# Altium integrated library CbyP.IntLib: 1144 symbols (part 1 of 6)
Pins are listed as number, name and electrical type; pins without a type are passive.

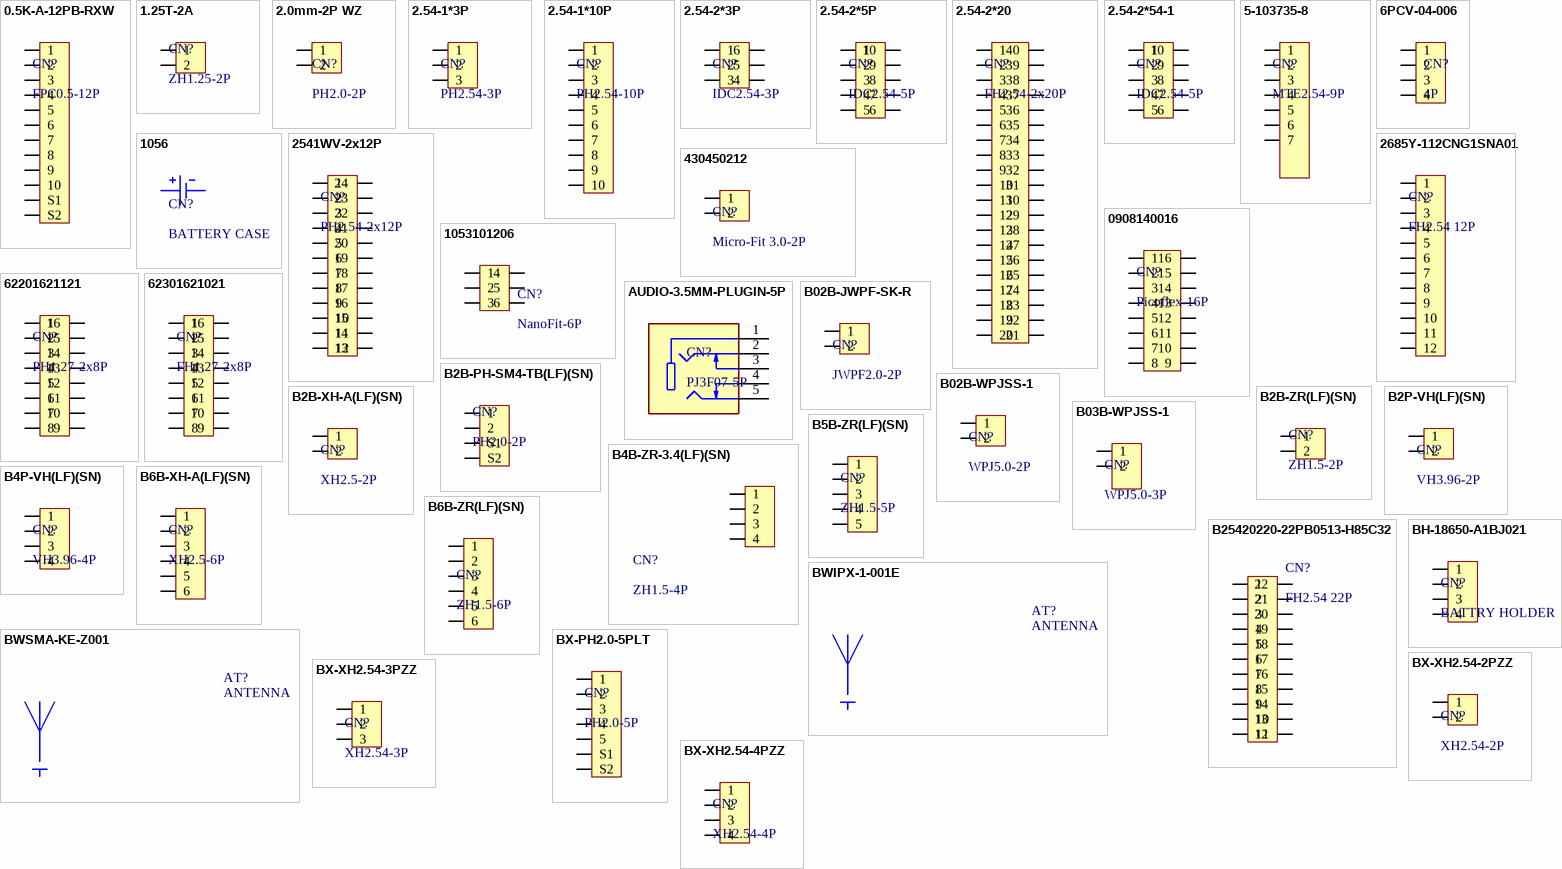
[diagram p0: symbols 0.5K-A-12PB-RXW to BX-XH2.54-4PZZ]

## 0.5K-A-12PB-RXW
designator CN?, comment FPC0.5-12P
Slide Lock -25℃~+85℃ 12P 0.5mm Single-side Contact/Vertical Surface Mount,Vertical SMD,P=0.5mm(Staggered Pins) FFC, FPC (Flat Flexible) Connector Housings RoHS; Manufacturer: GUOCONN; Mfr.Part #: 0.5K-A-12PB-RXW; LCSC Part #: C51901160; Package: SMD,P=0.5mm(Staggered Pins)
footprint FPC0.5-12P, Vertical SMD
pins: 1, 2, 3, 4, 5, 6, 7, 8, 9, 10, 11 S1, 12 S2

## 1.25T-2A
designator CN?, comment ZH1.25-2P
2P 1x2P PicoBlade(MX 1.25) Tin -25℃~+85℃ Beige 1.25mm 250V 2 3A 1 Through Hole Through Hole,P=1.25mm Headers, Male Pins RoHS; Manufacturer: BOOMELE(Boom Precision Elec); Mfr.Part #: 1.25T-2A; LCSC Part #: C145970; Package: Through Hole,P=1.25mm; DigiKey Part Number: NO
footprint Plugin,P=1.25mm,2P
pins: 1, 2

## 2.0mm-2P WZ
designator CN?, comment PH2.0-2P
2P 1x2P PH Tin -25℃~+85℃ White 2mm 250V 2 1A 1 Right Angle Through Hole,Right Angle,P=2mm Headers, Male Pins RoHS; Manufacturer: SHOU HAN; Mfr.Part #: 2.0MM-2P WZ; So_Chan_Dan: 0; LCSC Part #: C5368738; Package: Through Hole,Right Angle,P=2mm; DigiKey Part Number: NO
footprint Push-Pull,P=2mm,2P-2
footprint Push-Pull,P=2mm,2P-1
footprint Plugin,P=2.54mm,2P-1
pins: 1, 2

## 2.54-1*3P
designator CN?, comment PH2.54-3P
3P 1x3P Gold Brass -40℃~+105℃ Black Pin Header 2.54mm 2.5mm 6mm 3mm 1 3A Through Hole Through Hole,P=2.54mm Headers, Male Pins RoHS; Manufacturer: BOOMELE(Boom Precision Elec); Mfr.Part #: 2.54-1*3P; LCSC Part #: C49257; Package: Through Hole,P=2.54mm; DigiKey Part Number: NO
footprint Plugin,P=2.54mm,3P,Pin Headers
pins: 1, 2, 3

## 2.54-1*10P
designator CN?, comment PH2.54-10P
CONN HEADER 10POS 2.54mm SINGLE ROW TH; Manufacturer: BOOMELE(Boom Precision Elec); Mfr.Part #: 2.54-1*10P; LCSC Part #: C57369; Package: Plugin,P=2.54mm
footprint Plugin,P=2.54mm,10P,Pin Headers
pins: 1, 2, 3, 4, 5, 6, 7, 8, 9, 10

## 2.54-2*3P
designator CN?, comment IDC2.54-3P
Connector IDC Header Through Hole, Right Angle 6 position 2.54mm; Manufacturer: BOOMELE(Boom Precision Elec); Mfr.Part #: 2.54-2*3P; LCSC Part #: C34945; Package: Through Hole,Right Angle,P=2.54mm; DigiKey Part Number: NO; ComponentLink1Description: Link; ComponentLink1URL: https://www.lcsc.com/product-detail/C34945.html
footprint IDC Through Hole,Right Angle,P=2.54mm, 2x3P
pins: 1, 2, 3, 4, 5, 6

## 2.54-2*5P
designator CN?, comment IDC2.54-5P
Connector IDC Header Through Hole 10 position 2.54mm; Manufacturer: BOOMELE(Boom Precision Elec); Mfr.Part #: 2.54-2*5P; LCSC Part #: C5665; Package: Through Hole,P=2.54mm; DigiKey Part Number: NO; ComponentLink1Description: Link; ComponentLink1URL: https://www.lcsc.com/product-detail/C5665.html?s_z=n_2.54-2%2a5P
footprint IDC Through Hole,Right Angle,P=2.54mm, 2x5P
pins: 1, 2, 3, 4, 5, 6, 7, 8, 9, 10

## 2.54-2*20
designator CN?, comment FH2.54-2x20P
Female Header 40 Position 2.54mm Pitch Dual Row Through Hole -40℃~+105℃; Manufacturer: ZHOURI; Mfr.Part #: 2.54-2*20; LCSC Part #: C2977589; Package: Through Hole,P=2.54mm; DigiKey Part Number: NO; ComponentLink1Description: Link; ComponentLink1URL: https://www.lcsc.com/datasheet/C2977589.pdf
footprint Plugin,P=2.54mm,2x20P,Female Headers
pins: 1, 2, 3, 4, 5, 6, 7, 8, 9, 10, 11, 12, 13, 14, 15, 16, 17, 18, 19, 20, 21, 22, 23, 24, 25, 26, 27, 28, 29, 30, 31, 32, 33, 34, 35, 36, 37, 38, 39, 40

## 2.54-2*54-1
designator CN?, comment IDC2.54-5P
Connector IDC Header Through Hole, Right Angle 10 position 2.54mm; Manufacturer: BOOMELE(Boom Precision Elec); Mfr.Part #: 2.54-2*5P; LCSC Part #: C9140; Package: Through Hole,Right Angle,P=2.54mm; DigiKey Part Number: NO; ComponentLink1Description: Link; ComponentLink1URL: https://www.lcsc.com/product-detail/C9140.html?s_z=n_2.54-2%2a5P
footprint IDC Through Hole,P=2.54mm, 2X5P
pins: 1, 2, 3, 4, 5, 6, 7, 8, 9, 10

## 5-103735-8
designator CN?, comment MTE2.54-9P
Connector Header Through Hole 9 position 0.100" (2.54mm); Manufacturer: TE Connectivity AMP Connectors; Mfr.Part #: 5-103735-8; DigiKey Part Number: A33940-ND; Package: Plugin,P=2.54mm
footprint Plugin,P=2.54mm,7P
footprint Plugin,P=2.54mm,7P-1
pins: 1, 2, 3, 4, 5, 6, 7

## 6PCV-04-006
designator CN?, comment 4P
4 Circuit 0.375" (9.53mm) Barrier Block Connector Screws; Manufacturer: TE Connectivity AMP Connectors; Mfr.Part #: 6PCV-04-006; So_Chan_Cam: 2; So_Chan_Dan: 0; Web: Digikey; Name: 6PCV-04-006; Package: Plugin,P=375mil; ComponentLink1Description: Link; ComponentLink1URL: https://www.te.com/usa-en/product-4-1437652-0.datasheet.pdf
footprint Plugin,P=375mil,L=811mil,4P
pins: 1, 2, 3, 4

## 1056
designator CN?, comment BATTERY CASE
SMD Battery Product Accessories RoHS; Manufacturer: Keystone; Mfr.Part #: 1056; So_Chan_Cam: 0; LCSC Part #: C238067; Package: SMD
footprint SMD,BAT_CASE_1056
pins: 1, 2

## 2541WV-2x12P
designator CN?, comment PH2.54-2x12P
Gold Straight Policy 2.54mm 6mm 24P -55℃~+105℃ 3mm 2.54mm Double Row 2x12P Plugin,P=2.54mm Pin Headers ROHS; Manufacturer: HanElectricity; Mfr.Part #: 2541WV-2x12P; Package: Plugin,P=2.54mm; LCSC Part #: C5383110
footprint Plugin,P=2.54mm,2X12P,Pin Headers
pins: 1, 2, 3, 4, 5, 6, 7, 8, 9, 10, 11, 12, 13, 14, 15, 16, 17, 18, 19, 20, 21, 22, 23, 24

## 2685Y-112CNG1SNA01
designator CN?, comment FH2.54 12P
2.54mm 2.54mm 3A Single Row Gold 12P -40℃~+105℃ Brass Straight 1x12P 8.5mm Top Square Hole Plugin,P=2.54mm Female Headers ROHS; Manufacturer: HOAUC; Mfr.Part #: 2685Y-112CNG1SNA01; Package: Plugin,P=2.54mm; LCSC Part #: C5110232
footprint Plugin,P=2.54mm,12p,Female Headers
pins: 1, 2, 3, 4, 5, 6, 7, 8, 9, 10, 11, 12

## 430450212
designator CN?, comment Micro-Fit 3.0-2P
2x1P 2P Micro-Fit(MX 3.0) Tin 3mm 1 -40℃~+105℃ 8.5A 2 3mm Brass Through Hole Plugin,P=3mm Wire To Board Connector ROHS; Manufacturer: MOLEX; Mfr.Part #: 430450212; LCSC Part #: C293362; Package: Plugin,P=3mm
footprint Push-Pull,P=2.54mm,2P
pins: 1, 2

## 0908140016
designator CN?, comment Picoflex-16P
Connector Header Surface Mount 16 position 0.050" (1.27mm); Manufacturer: Molex; Mfr.Part #: 0908140016; DigiKey Part Number: WM19280-ND; Package: SMD,1.27mm
footprint Plugin,P=2.54mm,2x15P,Female Headers
pins: 1, 2, 3, 4, 5, 6, 7, 8, 9, 10, 11, 12, 13, 14, 15, 16

## 1053101206
designator CN?, comment NanoFit-6P
Connector Header Through Hole 6 position 0.098" (2.50mm); Manufacturer: Molex; Mfr.Part #: 1053101206; DigiKey Part Number: WM14970-ND; Package: Plugin,P=2.5mm
footprint Plugin,P=2.5mm,2X3P,Nano-Fit 6P Male
pins: 1, 2, 3, 4, 5, 6

## 62201621121
designator CN?, comment PH1.27-2x8P
Connector Header Through Hole 16 position 0.050" (1.27mm); Manufacturer: Würth Elektronik; Mfr.Part #: 62201621121; DigiKey Part Number: 732-5376-ND; Package: Plugin,P=1.27mm
footprint Plugin,P=1.27mm,2X8P,Pin Headers
pins: 1, 2, 3, 4, 5, 6, 7, 8, 9, 10, 11, 12, 13, 14, 15, 16

## 62301621021
designator CN?, comment FH1.27-2x8P
16 Position Receptacle Connector 0.050" (1.27mm) Surface Mount Gold; Manufacturer: Würth Elektronik; Mfr.Part #: 62301621021; DigiKey Part Number: 732-62301621021-ND; Package: SMD,P=1.27mm
footprint SMD,P=1.27mm,2x8P
pins: 1, 2, 3, 4, 5, 6, 7, 8, 9, 10, 11, 12, 13, 14, 15, 16

## AUDIO-3.5MM-PLUGIN-5P
designator CN?, comment PJ3F07-5P
-30℃~+70℃ 3.5mm headphone jack 30V 500mA Plugin Audio Connectors ROHS; MF: CUI Devices; MP: SJ1-3525N; SnapEDA_Link: https://www.snapeda.com/parts/SJ1-3525N/CUI+Devices/view-part/?ref=snap; Package: None; Value: *; CUI_purchase_URL: https://www.cuidevices.com/product/interconnect/connectors/audio-connectors/jacks/sj1-3525n?utm_source=snapeda.com&utm_medium=referral&utm_campaign=snapedaBOM; Check_prices: https://www.snapeda.com/parts/SJ1-3525N/CUI+Devices/view-part/?ref=eda
footprint AUDIO-3.5MM-PLUGIN-5P
pins: 1, 2, 3, 4, 5

## B02B-JWPF-SK-R
designator CN?, comment JWPF2.0-2P
Connector Header Through Hole 2 position 0.079" (2.00mm); Manufacturer: JST Sales America Inc.; Mfr.Part #: B02B-JWPF-SK-R; DigiKey Part Number: 455-1991-ND; Package: Plugin,P=2mm
footprint Push-Pull,P=2.54mm,2P
pins: 1, 2

## B2B-PH-SM4-TB(LF)(SN)
designator CN?, comment PH2.0-2P
Connector Header 2 position 2mm Pitch 2A Surface Mount,Vertical -25℃~+85℃; Manufacturer: JST; Mfr.Part #: B2B-PH-SM4-TB(LF)(SN); DigiKey Part Number: 455-B2B-PH-SM4-TBTR-ND; Package: SMD,P=2mm; LCSC Part #: C160352; ComponentLink1Description: Link; ComponentLink1URL: https://www.lcsc.com/product-detail/C160352.html; ComponentLink2Description: Link 1; ComponentLink2URL: https://www.digikey.com/en/products/detail/jst-sales-america-inc/B2B-ZR/926564?s=N4IgTCBcDaIEJjgWhttps://www.digikey.com/en/products/detail/jst-sales-america-inc/B2B-PH-SM4-TB/926641?s=N4IgTCBcDaIEJjgWgAoAkkGUCyAWJAKnABQAyAYgJTGYBylIAugL5AgFoCUAUAZAYgSgwGUA5PEAXQF8g
footprint SMD,P=2mm,2P
pins: 1, 2, S1, S2

## B02B-WPJSS-1
designator CN?, comment WPJ5.0-2P
Connector Header Through Hole 2 position 0.197" (5.00mm); Manufacturer: JST Sales America Inc.; Mfr.Part #: B02B-WPJSS-1; DigiKey Part Number: 455-B02B-WPJSS-1-ND; Package: Plugin,P=5mm
footprint Push-Pull,P=2.54mm,2P
pins: 1, 2

## B2B-XH-A(LF)(SN)
designator CN?, comment XH2.5-2P
Connector Header 2 position 2.5mm Pitch 3A Through Hole -25℃~+85℃; Manufacturer: JST; Mfr.Part #: B2B-XH-A(LF)(SN); LCSC Part #: C158012; Package: Through Hole,P=2.5mm; DigiKey Part Number: 455-B2B-XH-A-ND; ComponentLink1Description: Link; ComponentLink1URL: https://www.lcsc.com/product-detail/C158012.html?s_z=n_B2B-XH-A; ComponentLink2Description: Link 1; ComponentLink2URL: https://www.digikey.com/en/products/detail/jst-sales-america-inc/B2B-XH-A/1651045?s=N4IgTCBcDaIEJjgWgBoAkkEEAUAZAYgJTYDKAcoSALoC%2BQA
footprint Through Hole,P=2.5mm,2P,JST
pins: 1, 2

## B2B-ZR(LF)(SN)
designator CN?, comment ZH1.5-2P
2P 1x2P ZH Tin -25℃~+85℃ White 1.5mm 50V 2 1A 1 Through Hole Through Hole,P=1.5mm Headers, Male Pins ROHS; Manufacturer: JST; Mfr.Part #: B2B-ZR(LF)(SN); DigiKey Part Number: 455-B2B-ZR(LF)(SN)(P)-ND; Package: Through Hole,P=1.5mm; LCSC Part #: C158011; ComponentLink1Description: Link; ComponentLink1URL: https://www.lcsc.com/product-detail/C158011.html?s_z=n_C158011; ComponentLink2Description: Link 1; ComponentLink2URL: https://www.digikey.com/en/products/detail/jst-sales-america-inc/B2B-ZR/926564?s=N4IgTCBcDaIEJjgWgFoCUAUAZAYgSgwGUA5PEAXQF8g
footprint Plugin,P=1.5mm,2P
pins: 1, 2

## B2P-VH(LF)(SN)
designator CN?, comment VH3.96-2P
Connector Header 2 position 3.96mm Pitch 10A Through Hole -25℃~+85℃; Manufacturer: JST; Mfr.Part #: B2P-VH(LF)(SN); LCSC Part #: C160315; Package: Through Hole,P=3.96mm; DigiKey Part Number: 455-1639-ND; ComponentLink1Description: Link; ComponentLink1URL: https://www.lcsc.com/product-detail/C160315.html?s_z=n_C160315; ComponentLink2Description: Link 1; ComponentLink2URL: https://www.digikey.com/en/products/detail/jst-sales-america-inc/B2P-VH/926547?s=N4IgTCBcDaIEJgAoFoBqAJAFAGQGIEpMBlAOXxAF0BfIA
footprint Through Hole,P=3.96mm,2P
pins: 1, 2

## B03B-WPJSS-1
designator CN?, comment WPJ5.0-3P
Connector Header Through Hole 3 position 0.197" (5.00mm); Manufacturer: JST Sales America Inc.; Mfr.Part #: B03B-WPJSS-1; DigiKey Part Number: 455-B03B-WPJSS-1-ND; Package: Plugin,P=5mm
footprint Push-Pull,P=2.54mm,2P
pins: 1, 2

## B4B-ZR-3.4(LF)(SN)
designator CN?, comment ZH1.5-4P
Connector Header 4 position 1.5mm Pitch 1A Through Hole -25℃~+85℃; Manufacturer: JST; Mfr.Part #: B4B-ZR-3.4(LF)(SN); LCSC Part #: C163034; Package: Through Hole,P=1.5mm; DigiKey Part Number: 455-B4B-ZR-3.4-ND; ComponentLink1Description: Link; ComponentLink1URL: https://www.lcsc.com/product-detail/C163034.html?s_z=n_B4B-ZR-3.4%28LF%29%28SN%29; ComponentLink2Description: Link 1; ComponentLink2URL: https://www.digikey.com/en/products/detail/jst-sales-america-inc/B4B-ZR-3-4/7802273?s=N4IgTCBcDaIEIBY4FoBaAlZBmAdAgFADIBiAlPgMoBypIAugL5A
footprint Plugin,P=1.5mm,4P
pins: 1, 2, 3, 4

## B4P-VH(LF)(SN)
designator CN?, comment VH3.96-4P
1x4P 4P VH Tin 4 -25℃~+85℃ 10A 1 3.96mm Brass Through Hole Through Hole,P=3.96mm Wire To Board Connector ROHS; Manufacturer: JST; Mfr.Part #: B4P-VH(LF)(SN); LCSC Part #: C160317; Package: Through Hole,P=3.96mm
footprint Push-Pull,P=3.96mm,4P
pins: 1, 2, 3, 4

## B5B-ZR(LF)(SN)
designator CN?, comment ZH1.5-5P
1x5P 5P ZH Tin 5 -25℃~+85℃ 1A 1 1.5mm Brass Straight Plugin,P=1.5mm Wire To Board Connector ROHS; Manufacturer: JST; Mfr.Part #: B5B-ZR(LF)(SN); LCSC Part #: C157990; Package: Plugin,P=1.5mm
footprint Plugin,P=1.5mm,5P
pins: 1, 2, 3, 4, 5

## B6B-XH-A(LF)(SN)
designator CN?, comment XH2.5-6P
Connector Header 6 position 2.5mm Pitch 3A Through Hole -25℃~+85℃; Manufacturer: JST; Mfr.Part #: B6B-XH-A(LF)(SN); LCSC Part #: C144397; Package: Through Hole,P=2.5mm; DigiKey Part Number: 455-B6B-XH-A-ND; ComponentLink1Description: Link; ComponentLink1URL: https://www.lcsc.com/product-detail/C144397.html; ComponentLink2Description: Link 1; ComponentLink2URL: https://www.digikey.com/en/products/detail/jst-sales-america-inc/B6B-XH-A/1000381?s=N4IgTCBcDaIEIDY4FoAaAJZBBAFAGQDEBKHAZQDkiQBdAXyA
footprint Through Hole,P=2.5mm,6P,JST
pins: 1, 2, 3, 4, 5, 6

## B6B-ZR(LF)(SN)
designator CN?, comment ZH1.5-6P
1x6P 6P ZH Tin 6 -25℃~+85℃ 1A 1 1.5mm Brass Straight Plugin,P=1.5mm Wire To Board Connector ROHS; Manufacturer: JST; Mfr.Part #: B6B-ZR(LF)(SN); LCSC Part #: C157984; Package: Through Hole,P=1.5mm; DigiKey Part Number: 455-B6B-ZR-ND
footprint Plugin,P=1.5mm,6P
pins: 1, 2, 3, 4, 5, 6

## B25420220-22PB0513-H85C32
designator CN?, comment FH2.54 22P
2.54mm 1 22P Gold -40℃~+105℃ 1x22P Top 8.5mm 3A Square Hole Through Hole Through Hole,P=2.54mm Headers, Receptacles, Female Sockets ROHS; Manufacturer: HMTCONN; Mfr.Part #: B25420220-22PB0513-H85C32; LCSC Part #: C42385708; Package: Through Hole,P=2.54mm
footprint Plugin,P=2.54mm,22P,Female Headers
pins: 1, 2, 3, 4, 5, 6, 7, 8, 9, 10, 11, 12, 13, 14, 15, 16, 17, 18, 19, 20, 21, 22

## BH-18650-A1BJ021
designator CN?, comment BATTRY HOLDER
BATTERY HOLDER CYLINDRICAL TH; Manufacturer: MYOUNG; Mfr.Part #: BH-18650-A1BJ021; LCSC Part #: C20606804; Package: BATTRY HOLDER
footprint BATTERY_HOLDER_18650_TH,2S
pins: 1, 2, 3, 4

## BWIPX-1-001E
designator AT?, comment ANTENNA
Connector Receptacle IPEX Male Pin 50Ω Surface Mount; Manufacturer: BAT WIRELESS; Mfr.Part #: BWIPX-1-001E; Package: SMD; LCSC Part #: C496552; DigiKey Part Number: NO; ComponentLink1Description: Link; ComponentLink1URL: https://www.lcsc.com/product-detail/C496552.html?s_z=n_BWIPX-1-001E; ComponentLink2Description: Link 1
footprint IPEX-SMD
pins: 1, 2 GND, 3 GND, 4 GND

## BWSMA-KE-Z001
designator AT?, comment ANTENNA
CONN RCPT SMA 50Ω TH; Manufacturer: BAT WIRELESS; Mfr.Part #: BWSMA-KE-Z001; Package: Through Hole; LCSC Part #: C496549
footprint ANTENNA, Through Hole, SMA
pins: 1, 2 GND, 3 GND, 4 GND, 5 GND

## BX-PH2.0-5PLT
designator CN?, comment PH2.0-5P
CONN HEADER SMD 5POS 2mm; Manufacturer: Bossie; Mfr.Part #: BX-PH2.0-5PLT; LCSC Part #: C18077902; Package: SMD,P=2mm
footprint SMD,P=2mm,5P
pins: 1, 2, 3, 4, 5, S1 S2, S2 S1

## BX-XH2.54-2PZZ
designator CN?, comment XH2.54-2P
Connector Header 2 position 2.5mm Pitch 3A Through Hole -25℃~+85℃; Manufacturer: Bossie; Mfr.Part #: BX-XH2.54-2PZZ; LCSC Part #: C18077833; Package: Through Hole,P=2.5mm; DigiKey Part Number: NO; ComponentLink1Description: Link; ComponentLink1URL: https://www.lcsc.com/product-detail/C18077833.html?s_z=n_BX-XH2.54-2PZZ
footprint Plugin,P=2.54mm,2P
pins: 1, 2

## BX-XH2.54-3PZZ
designator CN?, comment XH2.54-3P
Connector Header 3 position 2.5mm Pitch 3A Through Hole -25℃~+85℃; Manufacturer: Bossie; Mfr.Part #: BX-XH2.54-3PZZ; LCSC Part #: C18077834; Package: Through Hole,P=2.5mm; DigiKey Part Number: NO; ComponentLink1Description: Link; ComponentLink1URL: https://www.lcsc.com/product-detail/C18077834.html?s_z=n_BX-XH2.54-3PZZ
footprint Plugin,P=2.54mm,3P
pins: 1, 2, 3

## BX-XH2.54-4PZZ
designator CN?, comment XH2.54-4P
Connector Header 4 position 2.5mm Pitch 3A Through Hole -25℃~+85℃; Manufacturer: Bossie; Mfr.Part #: BX-XH2.54-4PZZ; LCSC Part #: C18077835; Package: Through Hole,P=2.5mm; DigiKey Part Number: NO; ComponentLink1Description: Link; ComponentLink1URL: https://www.lcsc.com/product-detail/C18077835.html?s_z=n_BX-XH2.54-4PZZ
footprint Plugin,P=2.54mm,4P
pins: 1, 2, 3, 4

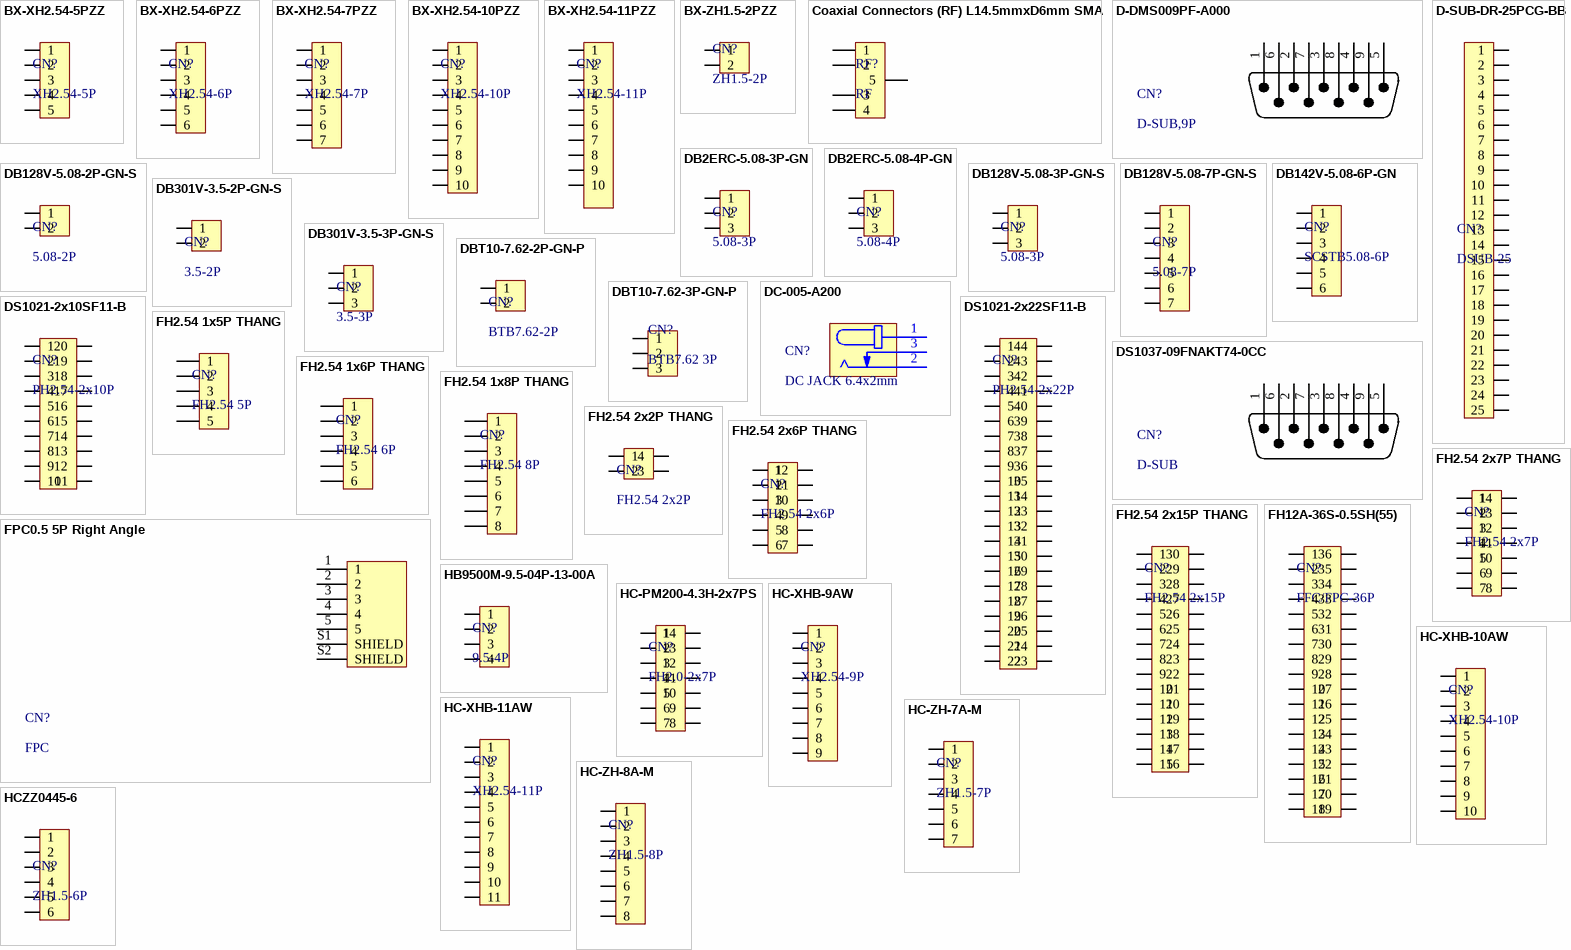
[diagram p1: symbols BX-XH2.54-5PZZ to HCZZ0445-6]

## BX-XH2.54-5PZZ
designator CN?, comment XH2.54-5P
Connector Header 5 position 2.5mm Pitch 3A Through Hole -25℃~+85℃; Manufacturer: Bossie; Mfr.Part #: BX-XH2.54-5PZZ; LCSC Part #: C18077836; Package: Through Hole,P=2.5mm; DigiKey Part Number: NO; ComponentLink1Description: Link; ComponentLink1URL: https://www.lcsc.com/product-detail/C18077836.html?s_z=n_BX-XH2.54-5PZZ; ComponentLink2Description: Link 1
footprint Through Hole,P=2.5mm,5P
pins: 1, 2, 3, 4, 5

## BX-XH2.54-6PZZ
designator CN?, comment XH2.54-6P
Connector Header 6 position 2.5mm Pitch 3A Through Hole -25℃~+85℃; Manufacturer: Bossie; Mfr.Part #: BX-XH2.54-6PZZ; LCSC Part #: C18077837; Package: Through Hole,P=2.5mm; DigiKey Part Number: NO; ComponentLink1Description: Link; ComponentLink1URL: https://www.lcsc.com/product-detail/C18077837.html?s_z=n_q_BX-XH2.54-6PZZ&spm=wm.fly.bg.0.xh&lcsc_vid=QwANA1wDQFZaUVwDFVMPAgBWElkNUgBVEVRdUVMCRAcxVlNRT1BXU1xQQVJfVTsOAxUeFF5JWBYZEEoKFBINSQcJGk4NBhADEA4cHktRTlNADxALGw%3D%3D; ComponentLink2Description: Link 1
footprint Through Hole,P=2.5mm,6P,JST
footprint Through Hole,P=2.5mm,6P
pins: 1, 2, 3, 4, 5, 6

## BX-XH2.54-7PZZ
designator CN?, comment XH2.54-7P
Connector Header 7 position 2.5mm Pitch 3A Through Hole -25℃~+85℃; Manufacturer: Bossie; Mfr.Part #: BX-XH2.54-7PZZ; LCSC Part #: C18077838; Package: Through Hole,P=2.5mm; DigiKey Part Number: NO; ComponentLink1Description: Link; ComponentLink1URL: https://www.lcsc.com/product-detail/C18077838.html?s_z=n_BX-XH2.54-7PZZ; ComponentLink2Description: Link 1
footprint Plugin,P=2.54mm,7P
pins: 1, 2, 3, 4, 5, 6, 7

## BX-XH2.54-10PZZ
designator CN?, comment XH2.54-10P
Connector Header 10 position 2.5mm Pitch 3A Through Hole -25℃~+85℃; Manufacturer: Bossie; Mfr.Part #: BX-XH2.54-10PZZ; LCSC Part #: C18077841; Package: Through Hole,P=2.5mm; DigiKey Part Number: NO; ComponentLink1Description: Link; ComponentLink1URL: https://www.lcsc.com/product-detail/C18077841.html?s_z=n_BX-XH2.54-10PZZ
footprint Plugin,P=2.54mm,10P
pins: 1, 2, 3, 4, 5, 6, 7, 8, 9, 10

## BX-XH2.54-11PZZ
designator CN?, comment XH2.54-11P
Connector Header 11 position 2.5mm Pitch 3A Through Hole -25℃~+85℃; Manufacturer: Bossie; Mfr.Part #: BX-XH2.54-11PZZ; LCSC Part #: C22367994; Package: Through Hole,P=2.5mm; DigiKey Part Number: NO; ComponentLink1Description: Link; ComponentLink1URL: https://www.lcsc.com/product-detail/C22367994.html?s_z=n_BX-XH2.54-11PZZ
footprint Plugin,P=2.54mm,10P
pins: 1, 2, 3, 4, 5, 6, 7, 8, 9, 10

## BX-ZH1.5-2PZZ
designator CN?, comment ZH1.5-2P
1x3P 3P ZH Tin 3 -25℃~+85℃ 1A 1 1.5mm Brass Straight Plugin,P=1.5mm Wire To Board Connector ROHS; Manufacturer: Bossie; Mfr.Part #: BX-ZH1.5-2PZZ; Package: Through Hole,P=1.5mm; LCSC Part #: C18077727
footprint Plugin,P=1.5mm,2P
pins: 1, 2

## Coaxial Connectors (RF) L14.5mmxD6mm SMA
designator RF?, comment RF
1 Inner Hole SMA Board-End Elbow 50Ω 5.3mm Plugin Coaxial Connectors (RF) ROHS; Manufacturer: BAT WIRELESS; Mfr.Part #: BWSMA-KWE-Z001; Name: PH2.0 2P THANG; So_Chan_Cam: 5; So_Chan_Dan: 0; Package: Plugin
footprint SMA,RF
pins: 1, 2, 3, 4, 5

## D-DMS009PF-A000
designator CN?, comment D-SUB,9P
Connector Standard D-Sub, Female 9 Position 2 Row Through Hole; Manufacturer: Ckmtw; Mfr.Part #: D-DMS009PF-A000; LCSC Part #: C189689; Package: Through Hole; DigiKey Part Number: NO
footprint D-Sub, 9P, Through Hole
pins: 1, 2, 3, 4, 5, 6, 7, 8, 9

## D-SUB-DR-25PCG-BB
designator CN?, comment DSUB-25
Connector D-Sub, Male 25 Position 2 Row Through Hole, Right Angle; Mfr.Part#: D-SUB-DR-25PCG-BB; Manunfacturer: XUNPU; LCSC Part #: C19077345; Package: Through Hole,Right Angle; DigiKey Part Number: NO; ComponentLink1Description: Link; ComponentLink1URL: https://www.lcsc.com/product-detail/C19077345.html; ComponentLink2Description: Link 1
footprint D-Sub, 25P, Through Hole,Right Angle
pins: 1, 2, 3, 4, 5, 6, 7, 8, 9, 10, 11, 12, 13, 14, 15, 16, 17, 18, 19, 20, 21, 22, 23, 24, 25

## DB2ERC-5.08-3P-GN
designator CN?, comment 5.08-3P
TERM BLOCK HDR 3POS 5.08mm; Manufacturer: DORABO; Mfr.Part #: DB2ERC-5.08-3P-GN; LCSC Part #: C395744; Package: Through Hole,Right Angle,P=5.08mm
footprint Through Hole,Right Angle,P=5.08mm,3P
pins: 1, 2, 3

## DB2ERC-5.08-4P-GN
designator CN?, comment 5.08-4P
TERM BLOCK HDR 4POS 5.08mm; Manufacturer: DORABO; Mfr.Part #: DB2ERC-5.08-4P-GN; LCSC Part #: C395753; Package: Through Hole,Right Angle,P=5.08mm
footprint Through Hole,Right Angle,P=5.08mm,4P
pins: 1, 2, 3

## DB128V-5.08-2P-GN-S
designator CN?, comment 5.08-2P
2 Position Wire to Board Terminal Block Through Hole 5.08mm; Manufacturer: DORABO; Mfr.Part #: DB128V-5.08-2P-GN-S; LCSC Part #: C2915639; Package: Through Hole,P=5.08mm; DigiKey Part Number: NO; ComponentLink1Description: Link; ComponentLink1URL: https://www.lcsc.com/product-detail/C2915639.html?s_z=n_DB128V-5.08-2P-GN-S
footprint Through Hole,P=5.08mm,2P
pins: 1, 2

## DB128V-5.08-3P-GN-S
designator CN?, comment 5.08-3P
3 Position Wire to Board Terminal Block Through Hole 5.08mm; Manufacturer: DORABO; Mfr.Part #: DB128V-5.08-3P-GN-S; LCSC Part #: C2915640; Package: Through Hole,P=5.08mm; DigiKey Part Number: NO; ComponentLink1Description: Link; ComponentLink1URL: https://www.lcsc.com/product-detail/C2915640.html?s_z=n_DB128V-5.08-3P-GN-S; ComponentLink2Description: Link 1
footprint Through Hole,P=5.08mm,3P
pins: 1, 2, 3

## DB128V-5.08-7P-GN-S
designator CN?, comment 5.08-7P
7 Position Wire to Board Terminal Block Through Hole 2.54mm; Manufacturer: DORABO; Mfr.Part #: DB128V-5.08-7P-GN-S; LCSC Part #: C2927514; Package: Through Hole,P=5.08mm; DigiKey Part Number: NO; ComponentLink1Description: Link; ComponentLink1URL: https://www.lcsc.com/product-detail/C2927514.html; ComponentLink2Description: Link 1
footprint Through Hole,P=5.08mm,7P
pins: 1, 2, 3, 4, 5, 6, 7

## DB142V-5.08-6P-GN
designator CN?, comment SCSTB5.08-6P
1.5 5.08mm 14~24 1x6P -40℃~+105℃ 10A 6P 300V Straight Green 6 1 Plugin,P=5.08mm Spring Clamp System Terminal Block ROHS; Manufacturer: DORABO; Mfr.Part #: DB142V-5.08-6P-GN; Package: Plugin,P=5.08mm
footprint Plugin,P=5.08mm,6P-1
pins: 1, 2, 3, 4, 5, 6

## DB301V-3.5-2P-GN-S
designator CN?, comment 3.5-2P
2 Position Wire to Board Terminal Block Through Hole 3.5mm; Manufacturer: DORABO; Mfr.Part #: DB301V-3.5-2P-GN-S; DigiKey Part Number: NO; Package: Through Hole,P=3.5mm; LCSC Part #: C695629
footprint Through Hole,P=3.5mm,2P
pins: 1, 2

## DB301V-3.5-3P-GN-S
designator CN?, comment 3.5-3P
3 Position Wire to Board Terminal Block Through Hole 3.5mm; Manufacturer: DORABO; Mfr.Part #: DB301V-3.5-3P-GN-S; DigiKey Part Number: NO; Package: Through Hole,P=3.5mm; LCSC Part #: C695630
footprint Through Hole,P=3.5mm,3P
pins: 1, 2, 3

## DBT10-7.62-2P-GN-P
designator CN?, comment BTB7.62-2P
1x2P Side Mount 2-Side 7.62mm 1 2 24A -40℃~+105℃ Green 14~22 Straight Pin Through Hole,P=7.62mm Barrier Blocks RoHS; Manufacturer: DORABO; Mfr.Part #: DBT10-7.62-2P-GN-P; LCSC Part #: C395930; Package: Through Hole,P=7.62mm; DigiKey Part Number: NO
footprint Plugin,P=7.62mm,2P
pins: 1, 2

## DBT10-7.62-3P-GN-P
designator CN?, comment BTB7.62 3P
1x3P Corner Double-sided 3 1 7.62mm 24A -40℃~+105℃ 450V Green 14~22 Straight Needle Plugin,P=7.62mm Barrier Terminal Blocks ROHS; Manufacturer: DORABO; Mfr.Part #: DBT10-7.62-3P-GN-P; Package: Plugin,P=7.62mm
footprint Plugin,P=7.62mm,3P
pins: 1, 2, 3

## DC-005-A200
designator CN?, comment DC JACK 6.4x2mm
Power Barrel Connector Jack 2mm ID 6.4mm OD Through Hole, Right Angle; Manufacturer: XUNPU; Mfr.Part #: DC-005-A200; LCSC Part #: C720557; Package: Through Hole; DigiKey Part Number: NO; ComponentLink1Description: Link; ComponentLink1URL: https://www.lcsc.com/product-detail/C720557.html
footprint Plugin,JACK DC
pins: 1, 2, 3

## DS1021-2x10SF11-B
designator CN?, comment PH2.54-2x10P
Pin Header 20 Position 2.54mm Pitch Dual Row Through Hole; Manufacturer: CONNFLY Elec; Mfr.Part #: DS1021-2x10SF11-B; LCSC Part #: C7430406; Package: Through Hole,P=2.54mm; DigiKey Part Number: NO
footprint Plugin,P=2.54mm,2X10P,PIN HEADERS
pins: 1, 2, 3, 4, 5, 6, 7, 8, 9, 10, 11, 12, 13, 14, 15, 16, 17, 18, 19, 20

## DS1021-2x22SF11-B
designator CN?, comment PH2.54-2x22P
Pin Header 44 Position 2.54mm Pitch Dual Row Through Hole; Manufacturer: CONNFLY Elec; Mfr.Part #: DS1021-2x22SF11-B; LCSC Part #: C7430418; Package: Through Hole,P=2.54mm; DigiKey Part Number: NO
footprint Plugin,P=2.54mm,2x22P,PIN HEADERS
pins: 1, 2, 3, 4, 5, 6, 7, 8, 9, 10, 11, 12, 13, 14, 15, 16, 17, 18, 19, 20, 21, 22, 23, 24, 25, 26, 27, 28, 29, 30, 31, 32, 33, 34, 35, 36, 37, 38, 39, 40, 41, 42, 43, 44

## DS1037-09FNAKT74-0CC
designator CN?, comment D-SUB
Connector Standard D-Sub, Female 9 Position 2 Row Through Hole, Right Angle; Manufacturer: CONNFLY Elec; Mfr.Part #: DS1037-09FNAKT74-0CC; LCSC Part #: C75749; Package: Through Hole,Right Angle; DigiKey Part Number: NO
footprint D-Sub, 9P,Push-Pull,Female
pins: 1, 2, 3, 4, 5, 6, 7, 8, 9

## FH2.54 1x5P THANG
designator CN?, comment FH2.54 5P
2.54mm Plugin 5P Straight 1x5P Plugin,P=2.54mm Female Headers ROHS; Manufacturer: BOOMELE(Boom Precision Elec); Mfr.Part #: 2.54-1*5P; Name: FH2.54 1x5P THANG; So_Chan_Cam: 5; So_Chan_Dan: 0; Package: Plugin,P=2.54mm
footprint Plugin,P=2.54mm,5P,Female Headers
pins: 1, 2, 3, 4, 5

## FH2.54 1x6P THANG
designator CN?, comment FH2.54 6P
2.54mm Plugin 6P Straight 1x6P Plugin,P=2.54mm Female Headers ROHS; Manufacturer: BOOMELE(Boom Precision Elec); Mfr.Part #: 2.54-1*6P; Name: FH2.54 1x6P THANG; So_Chan_Cam: 6; So_Chan_Dan: 0; Package: Plugin,P=2.54mm
footprint Plugin,P=2.54mm,6P,Female Headers
pins: 1, 2, 3, 4, 5, 6

## FH2.54 1x8P THANG
designator CN?, comment FH2.54 8P
2.54mm Single Row 8P Direct Insert 1x8P Plugin,P=2.54mm Female Headers ROHS; Manufacturer: BOOMELE(Boom Precision Elec); Mfr.Part #: 2.54-1*8P; Name: FH2.54 1x8P THANG; So_Chan_Cam: 8; So_Chan_Dan: 0; Package: Plugin,P=2.54mm
footprint Plugin,P=2.54mm,8P,Female Headers
pins: 1, 2, 3, 4, 5, 6, 7, 8

## FH2.54 2x2P THANG
designator CN?, comment FH2.54 2x2P
Top 2.54mm 8.5mm Direct Insert Square Hole -40℃~+105℃ 2x2P 2.54mm 3A Double Row 4P Copper alloy Plugin; Manufacturer: HCTL; Mfr.Part #: PM254-2-02-Z-8.5; Name: FH2.54 2x2P THANG; So_Chan_Cam: 4; So_Chan_Dan: 0; Package: Plugin,P=2.54mm
footprint Plugin,P=2.54mm,2x2P,Female Headers
pins: 1, 2, 3, 4

## FH2.54 2x6P THANG
designator CN?, comment FH2.54 2x6P
2.54mm 2.54mm Double Row 3A Copper alloy 12P -40℃~+105℃ Direct Insert 2x6P 8.5mm Top Square Hole Plugin,P=2.54mm Female Headers ROHS; Manufacturer: HCTL; Mfr.Part #: PM254-2-06-Z-8.5; Name: FH2.54 2x6P THANG; So_Chan_Cam: 12; So_Chan_Dan: 0; Package: Plugin,P=2.54mm
footprint Plugin,P=2.54mm,2x6P,Female Headers
pins: 1, 2, 3, 4, 5, 6, 7, 8, 9, 10, 11, 12

## FH2.54 2x7P THANG
designator CN?, comment FH2.54 2x7P
Top 2.54mm 8.5mm 2x7P Direct Insert Square Hole -40℃~+105℃ 2.54mm 3A Double Row 14P Copper alloy Plugin; Manufacturer: HCTL; Mfr.Part #: PM254-2-07-Z-8.5; Name: FH2.54 2x7P THANG; So_Chan_Cam: 14; So_Chan_Dan: 0; Package: Plugin,P=2.54mm
footprint Plugin,P=2.54mm,2x7P,Female Headers
pins: 1, 2, 3, 4, 5, 6, 7, 8, 9, 10, 11, 12, 13, 14

## FH2.54 2x15P THANG
designator CN?, comment FH2.54 2x15P
2.54mm 2.54mm Double Row 3A Copper alloy 30P -40℃~+105℃ Direct Insert 2x15P 8.5mm Top Square Hole Plugin,P=2.54mm Female Headers ROHS; Manufacturer: HCTL; Mfr.Part #: PM254-2-15-Z-8.5; Name: FH2.54 2x15P THANG; So_Chan_Cam: 30; So_Chan_Dan: 0; Package: Plugin,P=2.54mm
footprint Plugin,P=2.54mm,2x15P,Female Headers
pins: 1, 2, 3, 4, 5, 6, 7, 8, 9, 10, 11, 12, 13, 14, 15, 16, 17, 18, 19, 20, 21, 22, 23, 24, 25, 26, 27, 28, 29, 30

## FH12A-36S-0.5SH(55)
designator CN?, comment FFC/FPC-36P
FFC/FPC Connector 36 Position 0.5mm Pitch Top Contact Surface Mount, Right Angle -40℃~+85℃; Manufacturer: Hirose Electric Co Ltd; Mfr.Part #: FH12A-36S-0.5SH(55); LCSC Part #: C598000; Package: SMD,P=0.5mm,Surface Mount,Right Angle; DigiKey Part Number: HFK136TR-ND
footprint FH12A-36S-0.5SH(**)
pins: 1, 2, 3, 4, 5, 6, 7, 8, 9, 10, 11, 12, 13, 14, 15, 16, 17, 18, 19, 20, 21, 22, 23, 24, 25, 26, 27, 28, 29, 30, 31, 32, 33, 34, 35, 36

## FPC0.5 5P Right Angle
designator CN?, comment FPC
Drawer Type 6P Bottom Contact Horizontal attachment 0.5mm SMD,P=0.5mm,Surface Mount，Right Angle FFC, FPC (Flat Flexible) Connector Assemblies ROHS; Manufacturer: Warning; Name: None; So_Chan_Dan: 7; So_Chan_Cam: 0; Mfr.Part #: https://snapeda.com/shop?store=Mouser&id=2375057; Package: SMD,P=0.5mm,Surface Mount,Right Angle,5P
footprint SMD,P=0.5mm,Surface Mount,Right Angle,5P
pins: 1, 2, 3, 4, 5, S1 SHIELD, S2 SHIELD

## HB9500M-9.5-04P-13-00A
designator CN?, comment 9.5-4P
TERM BLK BARRIER 4CIRCUIT 9.5mm; Manufacturer: KANGNEX; Mfr.Part #: HB9500M-9.5-04P-13-00A; LCSC Part #: C255007; Package: Through Hole,P=9.5mm
footprint Through Hole,P=9.5mm,4P
pins: 1, 2, 3, 4

## HC-PM200-4.3H-2x7PS
designator CN?, comment FH2.0-2x7P
14P 1.5A Surface Mount,Vertical -40℃~+105℃ 4.3mm 2x7P 2mm Top 2 Square Hole 2mm SMD,P=2mm Headers, Receptacles, Female Sockets RoHS; Manufacturer: Hong Cheng; Mfr.Part #: HC-PM200-4.3H-2x7PS; LCSC Part #: C22373875; Package: SMD,P=2mm; ComponentLink1Description: Link; ComponentLink1URL: https://www.lcsc.com/product-detail/C22373875.html; ComponentLink2Description: Link 1; DigiKey Part Number: NO
pins: 1, 2, 3, 4, 5, 6, 7, 8, 9, 10, 11, 12, 13, 14

## HC-XHB-9AW
designator CN?, comment XH2.54-9P
Connector Header 9 position 2.5mm Pitch 3A Right Angle -25℃~+85℃; Manufacturer: HCTL; Mfr.Part #: HC-XHB-9AW; LCSC Part #: C2845512; Package: Through Hole,Right Angle,P=2.5mm; DigiKey Part Number: NO
footprint Through Hole,Right Angle,P=2.5mm,9P
pins: 1, 2, 3, 4, 5, 6, 7, 8, 9

## HC-XHB-10AW
designator CN?, comment XH2.54-10P
Connector Header 10 position 2.5mm Pitch 3A Right Angle -25℃~+85℃; Manufacturer: HCTL; Mfr.Part #: HC-XHB-10AW; LCSC Part #: C2845513; Package: Through Hole,Right Angle,P=2.5mm; DigiKey Part Number: NO; ComponentLink1Description: Link; ComponentLink1URL: https://www.lcsc.com/product-detail/C2845513.html?s_z=n_HC-XHB-10AW
footprint Through Hole,Right Angle,P=2.5mm,10P
pins: 1, 2, 3, 4, 5, 6, 7, 8, 9, 10

## HC-XHB-11AW
designator CN?, comment XH2.54-11P
Connector Header 11 position 2.5mm Pitch 3A Right Angle -25℃~+85℃; Manufacturer: HCTL; Mfr.Part #: HC-XHB-11AW; LCSC Part #: C2845514; Package: Through Hole,Right Angle,P=2.5mm; DigiKey Part Number: NO; ComponentLink1Description: Link; ComponentLink1URL: https://www.lcsc.com/product-detail/C2845514.html?s_z=n_HC-XHB-11AW
footprint Through Hole,Right Angle,P=2.5mm,11P
pins: 1, 2, 3, 4, 5, 6, 7, 8, 9, 10, 11

## HC-ZH-7A-M
designator CN?, comment ZH1.5-7P
Through Hole ZH 250V 7 1 1.5mm 1A 7P -25℃~+85℃ Tin Beige 1x7P Through Hole,P=1.5mm Headers, Male Pins; Manufacturer: Hong Cheng; Mfr.Part #: HC-ZH-7A-M; LCSC Part #: C53454722; Package: Through Hole,P=1.5mm
footprint Through Hole,P=1.5mm,7P
pins: 1, 2, 3, 4, 5, 6, 7

## HC-ZH-8A-M
designator CN?, comment ZH1.5-8P
Through Hole ZH 250V 8 1 1.5mm 1A 8P -25℃~+85℃ Tin Beige 1x8P Through Hole,P=1.5mm Headers, Male Pins; Manufacturer: Hong Cheng; Mfr.Part #: HC-ZH-8A-M; LCSC Part #: C53454723; Package: Through Hole,P=1.5mm
footprint Through Hole,P=1.5mm,8P
pins: 1, 2, 3, 4, 5, 6, 7, 8

## HCZZ0445-6
designator CN?, comment ZH1.5-6P
6P ZH 1x6P Tin -25℃~+85℃ Beige 1.5mm 250V 6 1A 1 Through Hole Through Hole,P=1.5mm Headers, Male Pins ROHS; Manufacturer: Hong Cheng; Mfr.Part #: HCZZ0445-6; LCSC Part #: C7433607; Package: Through Hole,P=1.5mm
footprint Plugin,P=1.5mm,6P
pins: 1, 2, 3, 4, 5, 6

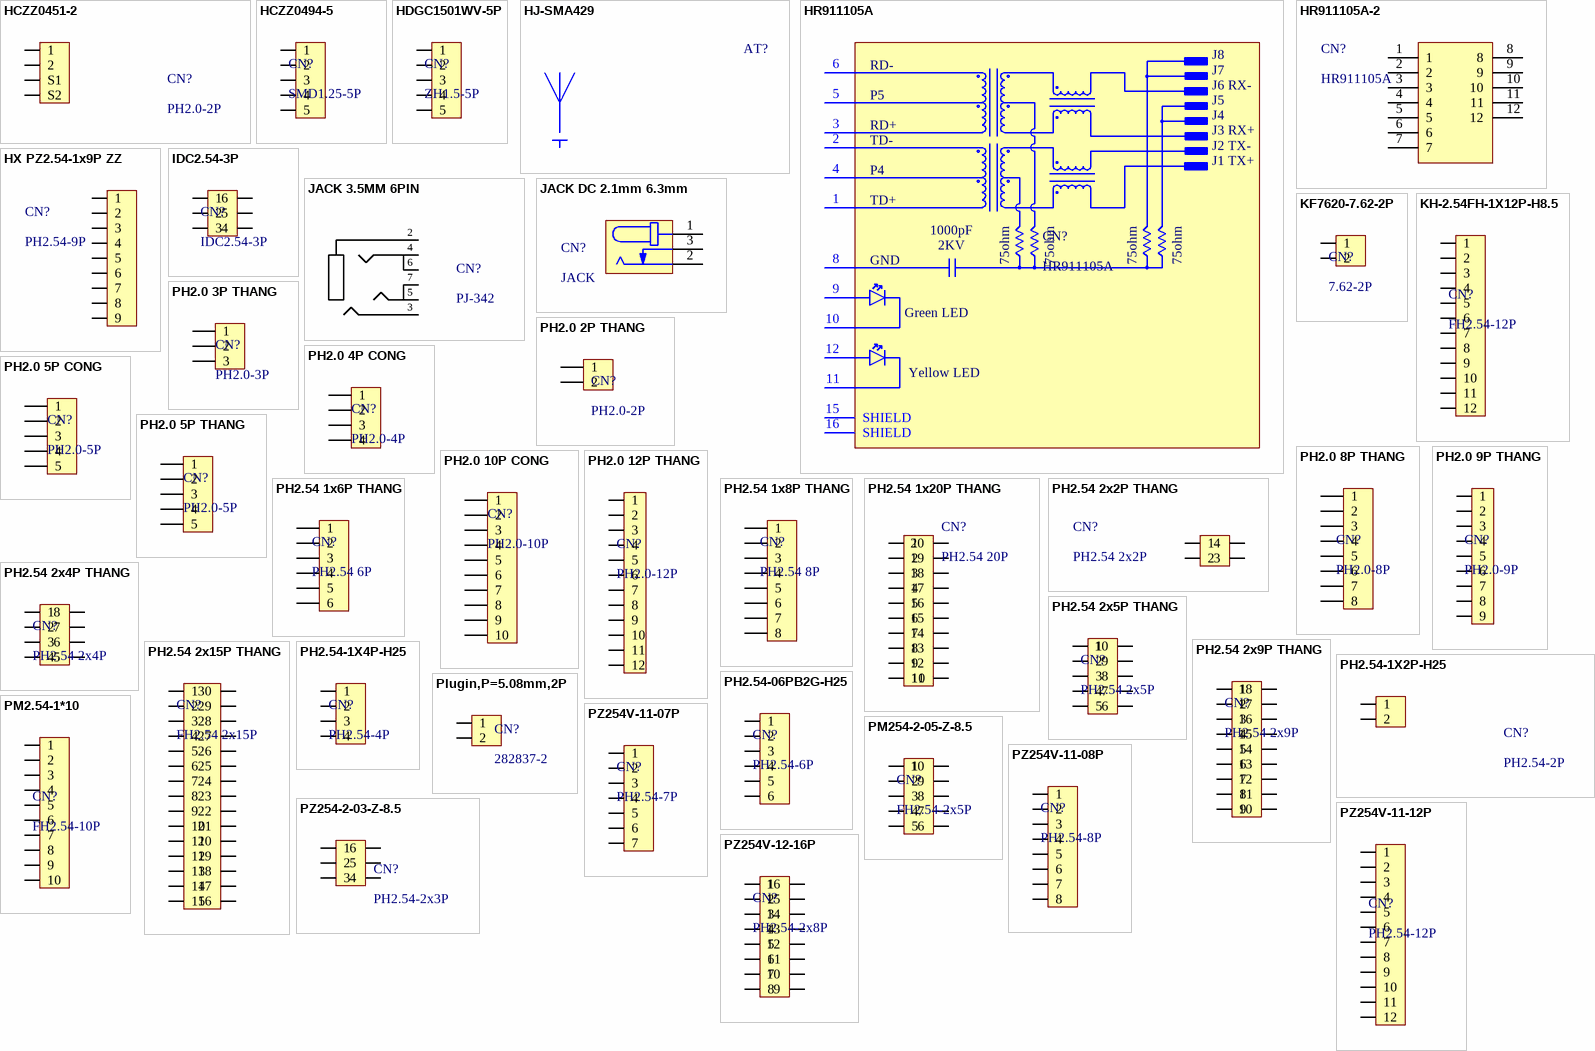
[diagram p2: symbols HCZZ0451-2 to PZ254V-12-16P]

## HCZZ0451-2
designator CN?, comment PH2.0-2P
SMD,P=2mm,Surface Mount,Right Angle; Manufacturer: Hong Cheng; Mfr.Part #: HCZZ0451-2; LCSC Part #: C7433648; Package: SMD,P=2mm,Surface Mount,Right Angle
footprint SMD,P=2mm,Surface Mount,Right Angle,2P
pins: 1, 2, S1, S2

## HCZZ0494-5
designator CN?, comment SMD1.25-5P
5P GH 1x5P Tin -25℃~+85℃ Beige 1.25mm 50V 5 1A 1 Surface Mount,Vertical SMD,p=1.25mm Headers, Male Pins ROHS; Manufacturer: Hong Cheng; Mfr.Part #: HCZZ0494-5; LCSC Part #: C7433501; Package: SMD,P=1.25mm
footprint SMD VERTICAL,P=1.25mm,5P
pins: 1, 2, 3, 4, 5

## HDGC1501WV-5P
designator CN?, comment ZH1.5-5P
5P 1x5P ZH Tin -25℃~+85℃ White 1.5mm 100V 5 1A 1 Through Hole Through Hole,P=1.5mm Headers, Male Pins ROHS; Manufacturer: HDGC; Mfr.Part #: HDGC1501WV-5P; LCSC Part #: C5175215; Package: Through Hole,P=1.5mm
footprint Plugin,P=1.5mm,5P
pins: 1, 2, 3, 4, 5

## HJ-SMA429
designator AT?, comment ANTENNA  (value not drawn)
CONN RCPT SMA TH R/A; Manufacturer: HJ Tech; Mfr.Part #: HJ-SMA429; Package: Through Hole; LCSC Part #: C1509208
footprint ANTENNA, Through Hole, Right Angle
pins: 1, 2 GND

## HR911105A
designator CN?
1 With LED Through Hole Modular/Ethernet Connector Jacks With Magnetics RoHS; Manufacturer: HANRUN(Zhongshan HanRun Elec); Package: Through Hole; LCSC Part #: C12074; DigiKey Part Number: NO; Mfr.Part #: HR911105A
footprint Plugin,RJ45,1
pins: 1 TD+, 2 TD-, 3 RD+, 4 P4, 5 P5, 6 RD-, 8 GND (power), 9 GA, 10 GC, 11 YC, 12 YA, 15 SHIELD, 16 SHIELD
text: J8; J7; J6 RX-; J5; J4; J3 RX+; J2 TX-; J1 TX+; 1000pF; 2KV; 75ohm; Green LED; Yellow LED

## HR911105A-2
designator CN?, comment HR911105A
RJ45Receptacle 1 WithLED Plugin Ethernet Connectors / Modular Connectors (RJ45 RJ11) ROHS; Manufacturer: HANRUN(Zhongshan HanRun Elec); So_Chan_Cam: 14; So_Chan_Dan: 0; Mfr.Part #: HR911105A; Name: HR911105A; Package: Plugin,P=2.54mm
footprint Plugin,RJ45,1
pins: 1, 2, 3, 4, 5, 6, 7, 8, 9, 10, 11, 12

## HX PZ2.54-1x9P ZZ
designator CN?, comment PH2.54-9P
CONN HEADER 9POS 2.54mm SINGLE ROW THROHS; Manufacturer: hanxia; Mfr.Part #: HX PZ2.54-1x9P ZZ; LCSC Part #: C42372501; Package: Through Hole,P=2.54mm
footprint Through Hole,P=2.54mm,9P,Female Headers
pins: 1, 2, 3, 4, 5, 6, 7, 8, 9

## IDC2.54-3P
designator CN?
Connector IDC Header Through Hole, Right Angle 6 position 2.54mm; Manufacturer: NO; Mfr.Part #: IDC2.54-3P; LCSC Part #: NO; Package: Through Hole,P=2.54mm; DigiKey Part Number: NO; ComponentLink1Description: Link; ComponentLink1URL: https://item.taobao.com/item.htm?app=chrome&bxsign=scdrn60USF3KyCUdwx_wVI46_hY1rizCMZznnNbZDB_aj9dfPxAL8lar5AngsUxElTDeat2oJY1tgD9_Lb2WGWQA1pf6DaHy5EUru_B5qmh3W7bQRxLC7hzyabehOH19yqVnFhDpmZE79bX0bLVpsW4gg&cpp=1&id=626492525858&price=1.75&shareUniqueId=31898993996&share_crt_v=1&shareurl=true&short_name=h.6znhRZ8g23hZC79&skuId=5763474036697&sourceType=item&sp_tk=M0JSMVZwcFVkNjM%3D&spm=a2159r.13376460.0.0&suid=d25be137-2e42-45d3-83ed-8dcf806b7be7&tbSocialPopKey=shareItem&tk=3BR1VppUd63&un=5f4fe317380873bd58f707390e73a9d0&un_site=0&ut_sk=1.Z4dFdGgQ4j8DAEpSeFpAROja_21646297_1749125331508.Copy.1&wxsign=tbwYAMh10yCjHf-P3IqM9rOnG47tfZaclxxKtTmloJVtletPgJRVWrprM1crbI1O5mGUfSx9erYkMtjBi4qS4uARFKYwpnYfrBtK0eu7JP89Up0dQhu5zgKr5EvcXCnrp-Susnpm5jj5NigBL-8zfTHcg
footprint FC Through Hole,P=2.54mm,2x3P
pins: 1, 2, 3, 4, 5, 6

## JACK 3.5MM 6PIN
designator CN?, comment PJ-342
-30℃~+70℃ 3.5mm Headphone Jack 30V 500mA SMD Audio Connectors (Headphones) ROHS; Manufacturer: SHOU HAN; Name: JACK 3.5MM 6PIN; So_Chan_Cam: 0; So_Chan_Dan: 6; Mfr.Part #: PJ-342; Package: PJ-342
footprint SMD-AUDIO-3.5MM-6PIN
pins: 2, 3, 4, 5, 6, 7

## JACK DC 2.1mm 6.3mm
designator CN?, comment JACK
Bend insert DC Power Receptacle -40℃~+55℃ 2.1mm 6.3mm 500mA 30V Plugin DC Power Connectors ROHS; Manufacturer: GANGYUAN; Mfr.Part #: DC-470-2.1GP; Name: JACK DC 2.1mm 6.3mm; So_Chan_Cam: 3; So_Chan_Dan: 0; Package: Plugin
footprint Plugin,JACK DC
pins: 1, 2, 3

## KF7620-7.62-2P
designator CN?, comment 7.62-2P
2 Position Wire to Board Terminal Block Through Hole 7.62mm; Manufacturer: Cixi Kefa Elec; Mfr.Part #: KF7620-7.62-2P; LCSC Part #: C475104; Package: Through Hole,P=7.62mm; DigiKey Part Number: NO; ComponentLink1Description: Link; ComponentLink1URL: https://www.lcsc.com/product-detail/C475104.html?s_z=n_KF7620-7.62-2P
footprint Through Hole,P=7.62mm,2P-1
pins: 1, 2

## KH-2.54FH-1X12P-H8.5
designator CN?, comment FH2.54-12P